# Altium footprint library Components.PcbLib: 260 footprints (part 7 of 17)
Each footprint in its own frame and in the unit in brackets; x right, y up, seen from the top. Pads: shape width x height; smd on the part's side, far side on the other; paste and mask are expansions set on the pad; w line width, h text height; cw(c..) or ccw(c..) is an arc to the next point about the centre after c.
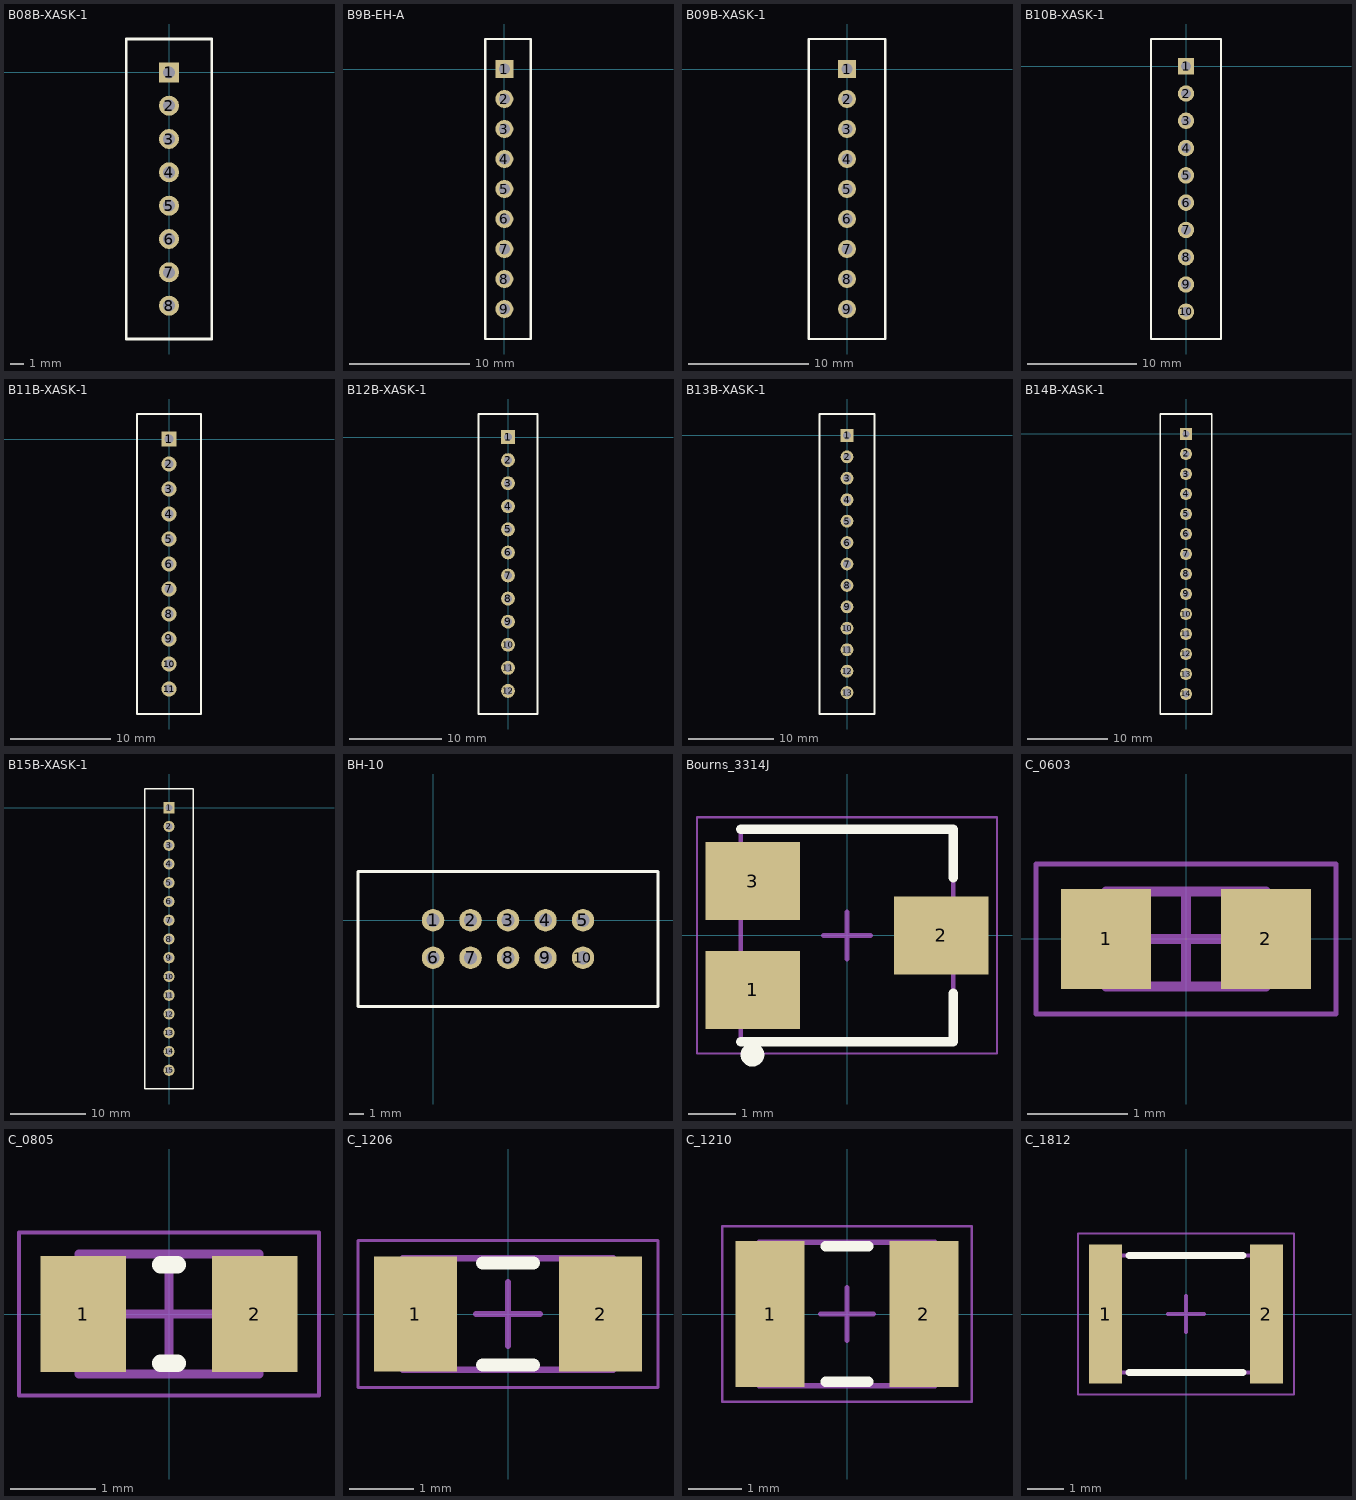
[diagram p6: the footprints below, top view; thin cyan lines are the x and y axes]

## B08B-XASK-1 [mm]
height 8.8
pads (8):
  rect 1.5x1.5 hole 0.9: 1(0,0)
  round 1.5 hole 0.9: 2(0,-2.5) 3(0,-5) 4(0,-7.5) 5(0,-10) 6(0,-12.5) 7(0,-15) 8(0,-17.5)
Top Overlay:
  lines w0.2: -3.2,-20 3.2,-20 3.2,2.5 -3.2,2.5 -3.2,-20
3D body "B08B-XASK-1.STEP": height 8.8, standoff -3.4, extent -3.2,-20 3.2,2.5

## B9B-EH-A [mm]
height 8.8
pads (9):
  rect 1.5x1.5 hole 0.9: 1(0,0)
  round 1.5 hole 0.9: 2(0,-2.5) 3(0,-5) 4(0,-7.5) 5(0,-10) 6(0,-12.5) 7(0,-15) 8(0,-17.5) 9(0,-20)
Top Overlay:
  lines w0.2: -1.6,-22.5 2.2,-22.5 2.2,2.5 -1.6,2.5 -1.6,-22.5
3D body "B9B-EH-A.STEP": height 6, standoff -3.2, extent -1.6,-22.5 2.2,2.5

## B09B-XASK-1 [mm]
height 8.8
pads (9):
  rect 1.5x1.5 hole 0.9: 1(0,0)
  round 1.5 hole 0.9: 2(0,-2.5) 3(0,-5) 4(0,-7.5) 5(0,-10) 6(0,-12.5) 7(0,-15) 8(0,-17.5) 9(0,-20)
Top Overlay:
  lines w0.2: -3.2,-22.5 3.2,-22.5 3.2,2.5 -3.2,2.5 -3.2,-22.5
3D body "B09B-XASK-1.STEP": height 8.8, standoff -3.4, extent -3.2,-22.5 3.2,2.5

## B10B-XASK-1 [mm]
height 8.8
pads (10):
  rect 1.5x1.5 hole 0.9: 1(0,0)
  round 1.5 hole 0.9: 2(0,-2.5) 3(0,-5) 4(0,-7.5) 5(0,-10) 6(0,-12.5) 7(0,-15) 8(0,-17.5) 9(0,-20) 10(0,-22.5)
Top Overlay:
  lines w0.2: -3.2,-25 3.2,-25 3.2,2.5 -3.2,2.5 -3.2,-25
3D body "B10B-XASK-1.STEP": height 8.8, standoff -3.4, extent -3.2,-25 3.2,2.5

## B11B-XASK-1 [mm]
height 8.8
pads (11):
  rect 1.5x1.5 hole 0.9: 1(0,0)
  round 1.5 hole 0.9: 2(0,-2.5) 3(0,-5) 4(0,-7.5) 5(0,-10) 6(0,-12.5) 7(0,-15) 8(0,-17.5) 9(0,-20) 10(0,-22.5) 11(0,-25)
Top Overlay:
  lines w0.2: -3.2,-27.5 3.2,-27.5 3.2,2.5 -3.2,2.5 -3.2,-27.5
3D body "B11B-XASK-1.STEP": height 8.8, standoff -3.4, extent -3.2,-27.5 3.2,2.5

## B12B-XASK-1 [mm]
height 8.8
pads (12):
  rect 1.5x1.5 hole 0.9: 1(0,0)
  round 1.5 hole 0.9: 2(0,-2.5) 3(0,-5) 4(0,-7.5) 5(0,-10) 6(0,-12.5) 7(0,-15) 8(0,-17.5) 9(0,-20) 10(0,-22.5) 11(0,-25) 12(0,-27.5)
Top Overlay:
  lines w0.2: -3.2,-30 -3.2,2.5 3.2,2.5 3.2,-30 -3.2,-30
3D body "B12B-XASK-1.STEP": height 8.8, standoff -3.4, extent -3.2,-30 3.2,2.5

## B13B-XASK-1 [mm]
height 8.8
pads (13):
  rect 1.5x1.5 hole 0.9: 1(0,0)
  round 1.5 hole 0.9: 2(0,-2.5) 3(0,-5) 4(0,-7.5) 5(0,-10) 6(0,-12.5) 7(0,-15) 8(0,-17.5) 9(0,-20) 10(0,-22.5) 11(0,-25) 12(0,-27.5) 13(0,-30)
Top Overlay:
  lines w0.2: -3.2,-32.5 -3.2,2.5 3.2,2.5 3.2,-32.5 -3.2,-32.5
3D body "B13B-XASK-1.STEP": height 8.8, standoff -3.4, extent -3.2,-32.5 3.2,2.5

## B14B-XASK-1 [mm]
height 8.8
pads (14):
  rect 1.5x1.5 hole 0.9: 1(0,0)
  round 1.5 hole 0.9: 2(0,-2.5) 3(0,-5) 4(0,-7.5) 5(0,-10) 6(0,-12.5) 7(0,-15) 8(0,-17.5) 9(0,-20) 10(0,-22.5) 11(0,-25) 12(0,-27.5) 13(0,-30) 14(0,-32.5)
Top Overlay:
  lines w0.2: -3.2,-35 3.2,-35 3.2,2.5 -3.2,2.5 -3.2,-35
3D body "B14B-XASK-1.STEP": height 8.8, standoff -3.4, extent -3.2,-35 3.2,2.5

## B15B-XASK-1 [mm]
height 8.8
pads (15):
  rect 1.5x1.5 hole 0.9: 1(0,0)
  round 1.5 hole 0.9: 2(0,-2.5) 3(0,-5) 4(0,-7.5) 5(0,-10) 6(0,-12.5) 7(0,-15) 8(0,-17.5) 9(0,-20) 10(0,-22.5) 11(0,-25) 12(0,-27.5) 13(0,-30) 14(0,-32.5) 15(0,-35)
Top Overlay:
  lines w0.2: -3.2,-37.5 -3.2,2.5 3.2,2.5 3.2,-37.5 -3.2,-37.5
3D body "B15B-XASK-1.STEP": height 8.8, standoff -3.4, extent -3.2,-37.5 3.2,2.5

## BH-10 [mil]
pads (10):
  round 60 hole 35: 1(0,0) 2(100,0) 3(200,0) 4(300,0) 5(400,0) 6(0,-100) 7(100,-100) 8(200,-100) 9(300,-100) 10(400,-100)
Top Overlay:
  lines w7.87: -200,-230 -200,130 600,130 600,-230 -200,-230
3D body "Flatcable.STEP": height 633.27, standoff -118.11, extent -202.76,-255.91 604.33,136.39

## Bourns_3314J [mm] "1K00 3314J-1-102E (BOU) 4.5x4.5mm INDUSTRIAL CERMET SEALED [90-00-66]"
height 2.55
pads (3):
  rect 2x1.65 smd: 1(-2,-1.15) 2(2,0) 3(-2,1.15)
Top Overlay:
  circle w0.25: c-2,-2.525 r0.125
  lines w0.2: -2.25,-2.25 2.25,-2.25 2.25,-1.225 ; -2.25,2.25 2.25,2.25 2.25,1.225
Mechanical 13:
  lines w0.1: -2.25,-2.25 -2.25,2.25 2.25,2.25 2.25,-2.25 -2.25,-2.25
Mechanical 15:
  lines w0.05: -3.175,-2.5 -3.175,2.5 3.175,2.5 3.175,-2.5 -3.175,-2.5
  lines w0.1: -0.5,0 0.5,0 ; 0,-0.5 0,0.5
3D body "3314J.step": height 2.67, standoff -0.06, extent -2.504,-2.5 2.5,2.5

## C_0603 [mm] "Chip Resistor, 2-Leads, Body 1,60x0,80mm, IPC Medium Density"
height 0.55
pads (2):
  rect 0.9x1 smd: 1(-0.8,0) 2(0.8,0)
Mechanical 13:
  lines w0.1: -0.8,-0.475 -0.8,0.475 0.8,0.475 0.8,-0.475 -0.8,-0.475
Mechanical 15:
  lines w0.05: -1.5,-0.75 -1.5,0.75 1.5,0.75 1.5,-0.75 -1.5,-0.75
  lines w0.1: -0.475,0 0.475,0 ; 0,-0.475 0,0.475
3D body "C0603.step": height 0.77, standoff -0.03, extent -0.8,-0.4 0.8,0.4

## C_0805 [mm] "Chip Resistor, 2-Leads, Body 2,00x1,25mm, IPC Medium Density"
height 0.55
pads (2):
  rect 1x1.35 smd: 1(-1,0) 2(1,0)
Top Overlay:
  lines w0.2: -0.1,-0.575 0.1,-0.575 ; -0.1,0.575 0.1,0.575
Mechanical 13:
  lines w0.1: -1.05,-0.7 1.05,-0.7 1.05,0.7 -1.05,0.7 -1.05,-0.7
Mechanical 15:
  lines w0.05: -1.75,-0.95 1.75,-0.95 1.75,0.95 -1.75,0.95 -1.75,-0.95
  lines w0.1: -0.5,0 0.5,0 ; 0,-0.5 0,0.5
3D body "C0805.step": height 0.58, standoff -0.02, extent -1,-0.625 1,0.625

## C_1206 [mm] "Chip Resistor, 2-Leads, Body 3,20x1,60mm, IPC Medium Density"
height 0.65
pads (2):
  rect 1.3x1.8 smd: 1(-1.45,0) 2(1.45,0)
Top Overlay:
  lines w0.2: -0.4,-0.8 0.4,-0.8 ; -0.4,0.8 0.4,0.8
Mechanical 13:
  lines w0.1: -1.65,-0.875 1.65,-0.875 1.65,0.875 -1.65,0.875 -1.65,-0.875
Mechanical 15:
  lines w0.05: -2.35,-1.15 2.35,-1.15 2.35,1.15 -2.35,1.15 -2.35,-1.15
  lines w0.1: -0.5,0 0.5,0 ; 0,-0.5 0,0.5
3D body "C1206.step": height 0.76, standoff -0.02, extent -1.6,-0.8 1.6,0.8

## C_1210 [mm] "Chip Resistor, 2-Leads, Body 3,20x2,50mm, IPC Medium Density"
height 0.65
pads (2):
  rect 1.3x2.75 smd: 1(-1.45,0) 2(1.45,0)
Top Overlay:
  lines w0.2: -0.4,-1.275 0.4,-1.275 ; -0.4,1.275 0.4,1.275
Mechanical 13:
  lines w0.1: -1.65,-1.35 -1.65,1.35 1.65,1.35 1.65,-1.35 -1.65,-1.35
Mechanical 15:
  lines w0.05: -2.35,-1.65 -2.35,1.65 2.35,1.65 2.35,-1.65 -2.35,-1.65
  lines w0.1: -0.5,0 0.5,0 ; 0,-0.5 0,0.5
3D body "C1210.step": height 0.76, standoff -0.02, extent -1.6,-1.25 1.6,1.25

## C_1812 [mm] "Ceramic Capacitors, 1812, body 4.5x3.2mm"
height 1.25
pads (2):
  rect 0.9x3.8 smd: 1(-2.2,0) 2(2.2,0)
Top Overlay:
  lines w0.2: -1.55,-1.6 1.55,-1.6 ; -1.55,1.6 1.55,1.6
Mechanical 13:
  lines w0.1: -2.25,-1.6 2.25,-1.6 2.25,1.6 -2.25,1.6 -2.25,-1.6
Mechanical 15:
  lines w0.05: -2.95,-2.2 2.95,-2.2 2.95,2.2 -2.95,2.2 -2.95,-2.2
  lines w0.1: -0.5,0 0.5,0 ; 0,-0.5 0,0.5
3D body "4.5x3.2x1.25x0.5.stp": height 1.28, standoff 0.03, extent -2.25,-1.6 2.25,1.6